# Altium footprint library ParsaLibrary.PcbLib: 526 footprints (part 2 of 33)
Each footprint in its own frame and in the unit in brackets; x right, y up, seen from the top. Pads: shape width x height; smd on the part's side, far side on the other; paste and mask are expansions set on the pad; w line width, h text height; cw(c..) or ccw(c..) is an arc to the next point about the centre after c.
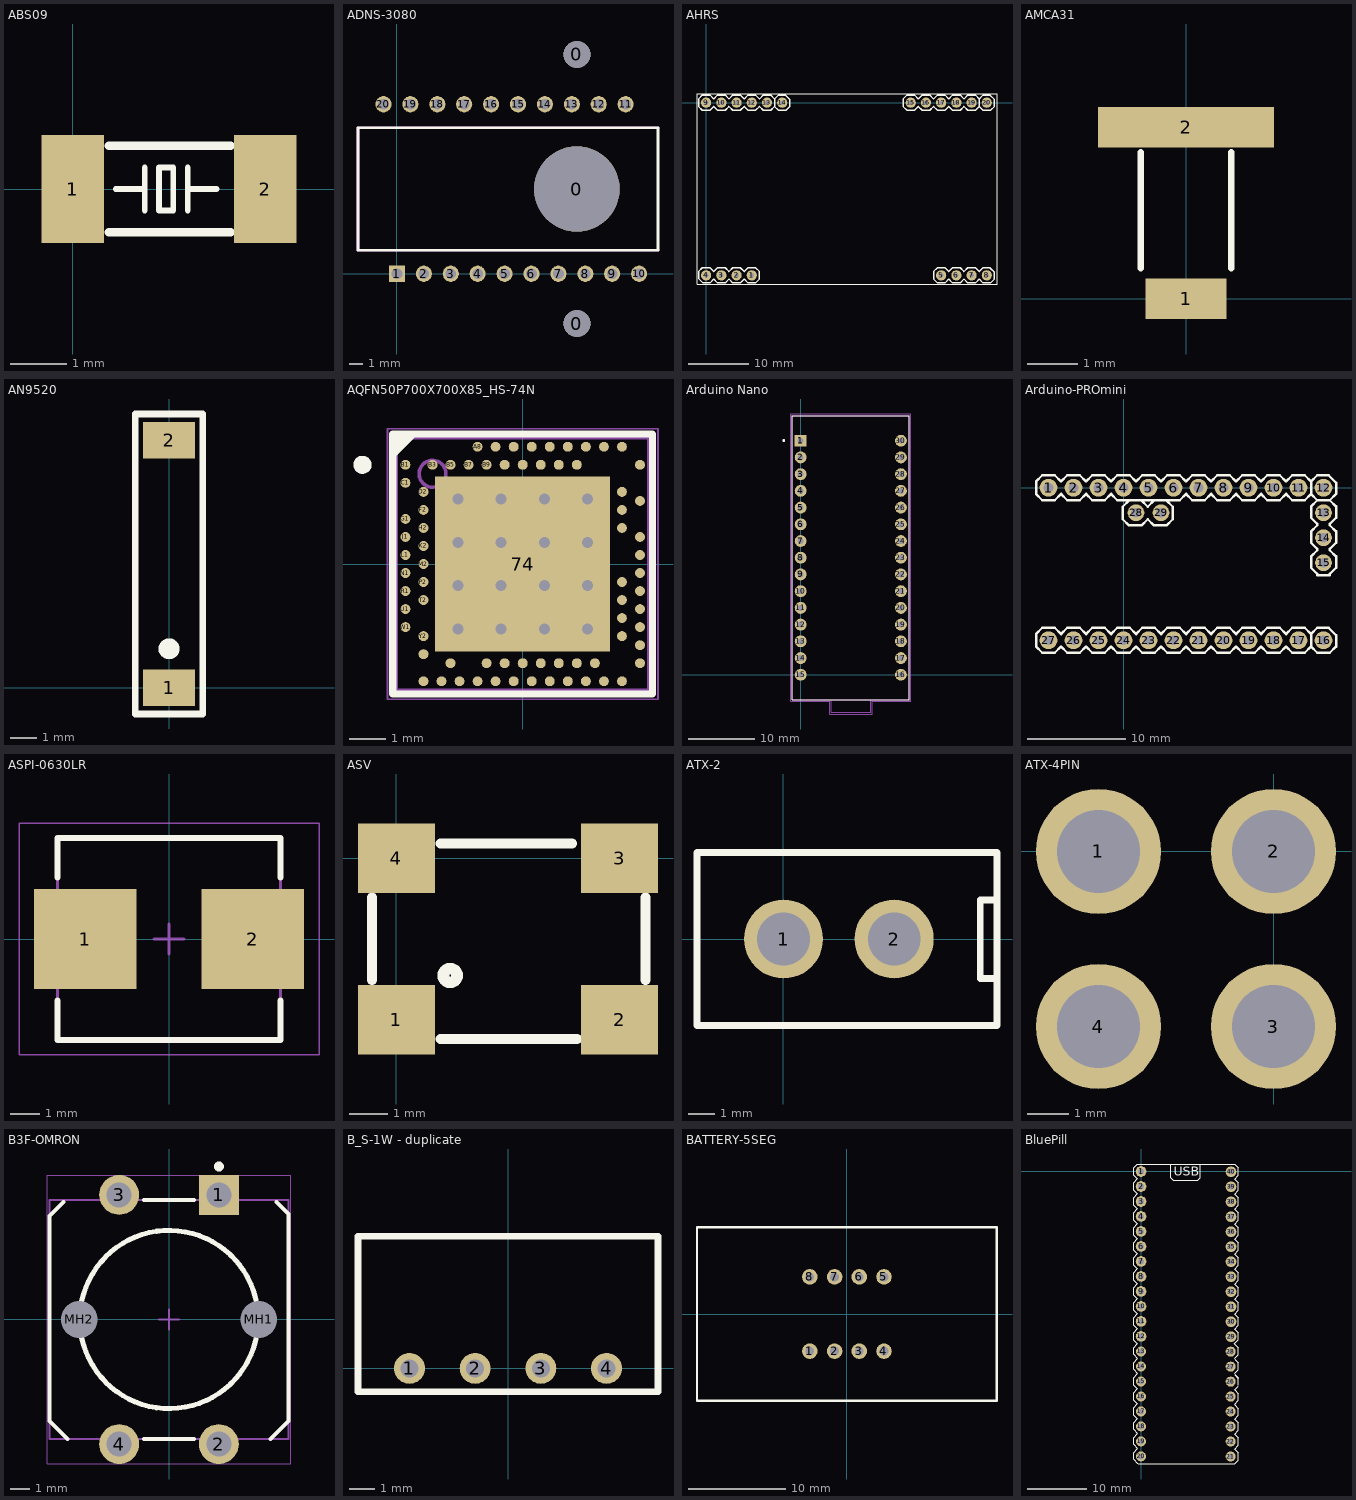
[diagram p1: the footprints below, top view; thin cyan lines are the x and y axes]

## ABS09 [mm] "CRYSTAL"
pads (2):
  rect 1.1x1.9 smd: 1(0,0) 2(3.4,0)
Top Overlay:
  lines w0.1: 0.762,0 1.27,0 ; 1.27,-0.381 1.27,0 ; 1.27,0.381 1.27,0 ; 2.032,-0.381 2.032,0.381 2.032,0 2.54,0 ; 1.524,-0.381 1.524,0.381 1.778,0.381 1.778,-0.381 1.524,-0.381
  lines w0.15: 0.635,-0.762 2.794,-0.762 ; 0.635,0.762 2.794,0.762
3D body "User Library-ABS09.STEP": height 0.9, standoff 0, extent -0.409,-0.762 3.711,0.758

## ADNS-3080 [mil]
pads (23):
  round 78.74 hole 78.74: 0(526.77,-145.67) 0(526.77,641.73)
  round 250 hole 250: 0(526.77,248.03)
  rect 47.25x47.25 hole 31.5: 1(0,0)
  round 47.25 hole 31.5: 2(78.74,0) 3(157.48,0) 4(236.22,0) 5(314.96,0) 6(393.7,0) 7(472.44,0) 8(551.18,0) 9(629.92,0) 10(708.66,0) 11(669.29,496.06) 12(590.55,496.06) 13(511.81,496.06) 14(433.07,496.06) 15(354.33,496.06) 16(275.59,496.06) 17(196.85,496.06) 18(118.11,496.06) 19(39.37,496.06) 20(-39.37,496.06)
Top Overlay:
  lines w8: -113.98,68.9 -113.98,427.16 763.98,427.16 763.98,68.9 -113.98,68.9
Mechanical 16:
  lines w8: 763.98,68.9 -113.98,68.9 -113.98,427.16 763.98,427.16

## AHRS [mm]
pads (20):
  round 1.7 hole 0.762: 1(7.62,-28.829) 2(5.08,-28.829) 3(2.54,-28.829) 4(0,-28.829) 5(39.243,-28.829) 6(41.783,-28.829) 7(44.323,-28.829) 8(46.863,-28.829) 9(0,0) 10(2.54,0) 11(5.08,0) 12(7.62,0) 13(10.16,0) 14(12.7,0) 15(34.163,0) 16(36.703,0) 17(39.243,0) 18(41.783,0) 19(44.323,0) 20(46.863,0)
Top Overlay:
  drawing of 152 lines, arcs and shapes, not listed
3D body "4pin.STEP": height 8.5, standoff -2.09, extent 38.024,-30.226 48.184,-27.686
3D body "4pin.STEP": height 8.5, standoff -2.09, extent -1.27,-30.15 8.89,-27.61
3D body "6pin.STEP": height 8.5, standoff -2.09, extent 32.995,-1.245 48.235,1.295
3D body "6pin.STEP": height 8.5, standoff -2.09, extent -1.245,-1.346 13.995,1.194
3D body "IMU.step": height 16.18, standoff 2.21, extent -1.607,-30.251 48.393,1.626

## AMCA31 [mm] "amd chip antenna"
pads (2):
  rect 1.6x0.8 smd: 1(0,0)
  rect 3.5x0.8 smd: 2(0,3.4)
Top Overlay:
  lines w0.127: -0.9,0.6 -0.9,2.9 ; 0.9,0.6 0.9,2.9
3D body "User Library-AMCA31-2R450G-S1F-T3.step": height 1.2, standoff 0, extent -0.8,0.1 0.8,3.3

## AN9520 [mm]
pads (2):
  rect 2x1.4 smd: 1(0,0) 2(0,9.5)
Top Overlay:
  circle w0.4: c0,1.5 r0.2
  lines w0.254: -1.3,-1 1.3,-1 1.3,10.5 -1.3,10.5 -1.3,-1
3D body "User Library-AN9520.step": height 1.05, standoff 0, extent -1.05,0.05 1.05,9.55

## AQFN50P700X700X85_HS-74N [mm]
pads (90):
  rect 4.85x4.85 smd paste-5 mask+0.05: 74(0,0)
  round 0.275 smd paste+0.012 mask+0.05: A8(-1.25,3.25) A10(-0.75,3.25) A12(-0.25,3.25) A14(0.25,3.25) A16(0.75,3.25) A18(1.25,3.25) A20(1.75,3.25) A22(2.25,3.25) A23(2.75,3.25) AA24(3.25,-2.25) AB2(-2.75,-2.5) AC5(-2,-2.75) AC9(-1,-2.75) AC11(-0.5,-2.75) AC13(0,-2.75) AC15(0.5,-2.75) AC17(1,-2.75) AC19(1.5,-2.75) AC21(2,-2.75) AC24(3.25,-2.75) AD2(-2.75,-3.25) AD4(-2.25,-3.25) AD6(-1.75,-3.25) AD8(-1.25,-3.25) AD10(-0.75,-3.25) AD12(-0.25,-3.25) AD14(0.25,-3.25) AD16(0.75,-3.25) AD18(1.25,-3.25) AD20(1.75,-3.25) AD22(2.25,-3.25) AD23(2.75,-3.25) B1(-3.25,2.75) B3(-2.5,2.75) B5(-2,2.75) B7(-1.5,2.75) B9(-1,2.75) B11(-0.5,2.75) B13(0,2.75) B15(0.5,2.75) B17(1,2.75) B19(1.5,2.75) B24(3.25,2.75) C1(-3.25,2.25) D2(-2.75,2) D23(2.75,2) E24(3.25,1.75) F2(-2.75,1.5) F23(2.75,1.5) G1(-3.25,1.25) H2(-2.75,1) H23(2.75,1) J1(-3.25,0.75) J24(3.25,0.75) K2(-2.75,0.5) L1(-3.25,0.25) L24(3.25,0.25) M2(-2.75,0) N1(-3.25,-0.25) N24(3.25,-0.25) P2(-2.75,-0.5) P23(2.75,-0.5) R1(-3.25,-0.75) R24(3.25,-0.75) T2(-2.75,-1) T23(2.75,-1) U1(-3.25,-1.25) U24(3.25,-1.25) V23(2.75,-1.5) W1(-3.25,-1.75) W24(3.25,-1.75) Y2(-2.75,-2) Y23(2.75,-2)
  rrect50% 0.94x0.94 on Top Paste: ""(-1.71,-1.71) ""(-1.71,-0.57) ""(-1.71,0.57) ""(-1.71,1.71) ""(-0.57,-1.71) ""(-0.57,-0.57) ""(-0.57,0.57) ""(-0.57,1.71) ""(0.57,-1.71) ""(0.57,-0.57) ""(0.57,0.57) ""(0.57,1.71) ""(1.71,-1.71) ""(1.71,-0.57) ""(1.71,0.57) ""(1.71,1.71)
via 1.8,-1.8 diameter 0.61 hole 0.305
via 0.6,-1.8 diameter 0.61 hole 0.305
via -0.6,-1.8 diameter 0.61 hole 0.305
via -1.8,-1.8 diameter 0.61 hole 0.305
via 1.8,-0.6 diameter 0.61 hole 0.305
via 0.6,-0.6 diameter 0.61 hole 0.305
via -0.6,-0.6 diameter 0.61 hole 0.305
via -1.8,-0.6 diameter 0.61 hole 0.305
via 1.8,0.6 diameter 0.61 hole 0.305
via 0.6,0.6 diameter 0.61 hole 0.305
via -0.6,0.6 diameter 0.61 hole 0.305
via -1.8,0.6 diameter 0.61 hole 0.305
via 1.8,1.8 diameter 0.61 hole 0.305
via 0.6,1.8 diameter 0.61 hole 0.305
via -0.6,1.8 diameter 0.61 hole 0.305
via -1.8,1.8 diameter 0.61 hole 0.305
Top Overlay:
  circle w0.25: c-4.44,2.75 r0.125
  region: -3,3.5 -3.5,3 -3.5,3.5
  lines w0.2: -3.6,-3.6 3.6,-3.6 3.6,3.6 -3.6,3.6 -3.6,-3.6
Mechanical 7:
  circle w0.1: c-2.5,2.5 r0.373
  lines w0.1: -3.5,-3.5 -3.5,3.5 3.5,3.5 3.5,-3.5 -3.5,-3.5
  text ".Designator" at -0.75,-0.25 h0.38
Mechanical 15:
  lines w0.05: -3.75,-3.75 3.75,-3.75 3.75,3.75 -3.75,3.75 -3.75,-3.75
  lines w0.1: -0.5,0 0.5,0 ; 0,-0.5 0,0.5
3D body "LGA88C25P25X25_700X700X85.step": height 0.85, standoff 0, extent -3.55,-3.55 3.55,3.55

## Arduino Nano [mm]
pads (30):
  rect 1.8x1.8 hole 0.9: 1(-0.005,35.549)
  round 1.8 hole 0.9: 2(-0.005,33.009) 3(-0.005,30.469) 4(-0.005,27.929) 5(-0.005,25.389) 6(-0.005,22.849) 7(-0.005,20.309) 8(-0.005,17.769) 9(-0.005,15.229) 10(-0.005,12.689) 11(-0.005,10.149) 12(-0.005,7.609) 13(-0.005,5.069) 14(-0.005,2.529) 15(-0.005,-0.011) 16(15.235,-0.011) 17(15.235,2.529) 18(15.235,5.069) 19(15.235,7.609) 20(15.235,10.149) 21(15.235,12.689) 22(15.235,15.229) 23(15.235,17.769) 24(15.235,20.309) 25(15.235,22.849) 26(15.235,25.389) 27(15.235,27.929) 28(15.235,30.469) 29(15.235,33.009) 30(15.235,35.549)
Top Overlay:
  circle w0.2: c-2.585,35.569 r0.1
  lines w0.127: -1.275,-3.821 -1.275,39.359 16.505,39.359 16.505,-3.821 -1.275,-3.821
Mechanical 13:
  circle w0.2: c-2.585,35.569 r0.1
  lines w0.127: 4.645,-3.821 4.645,-5.726 10.615,-5.726 10.615,-3.821 ; 4.645,-3.821 -1.275,-3.821 -1.275,39.359 16.505,39.359 16.505,-3.821 10.615,-3.821 ; 4.645,-3.821 10.615,-3.821
Mechanical 15:
  lines w0.05: -1.525,-4.071 4.395,-4.071 4.395,-5.976 10.865,-5.976 10.865,-4.071 16.755,-4.071 16.755,39.609 -1.525,39.609 -1.525,-4.071
3D body "User Library-arduino_nano.STEP": height 12.64, standoff -5.96, extent -1.385,-5.641 16.614,39.359

## Arduino-PROmini [mm]
pads (29):
  round 1.8 hole 1: 1(-7.62,0) 2(-5.08,0) 3(-2.54,0) 4(0,0) 5(2.54,0) 6(5.08,0) 7(7.62,0) 8(10.16,0) 9(12.7,0) 10(15.24,0) 11(17.78,0) 12(20.32,0) 16(20.32,-15.5) 17(17.78,-15.5) 18(15.24,-15.5) 19(12.7,-15.5) 20(10.16,-15.5) 21(7.62,-15.5) 22(5.08,-15.5) 23(2.54,-15.5) 24(0,-15.5) 25(-2.54,-15.5) 26(-5.08,-15.5) 27(-7.62,-15.5)
  round 1.7 hole 1: 13(20.32,-2.54) 14(20.32,-5.08) 15(20.32,-7.62) 28(1.27,-2.54) 29(3.81,-2.54)
Top Overlay:
  drawing of 209 lines, arcs and shapes, not listed
3D body "2pinheader.STEP": height 0.84, standoff -10.08, extent -3.81,-1.27 1.27,1.27
3D body "2pinheader.STEP": height 0.84, standoff -10.08, extent 1.27,-1.27 6.35,1.27
3D body "2pinheader.STEP": height 0.84, standoff -10.08, extent 6.35,-1.27 11.43,1.27
3D body "2pinheader.STEP": height 0.84, standoff -10.08, extent 11.43,-1.27 16.51,1.27
3D body "2pinheader.STEP": height 0.74, standoff -10.18, extent 16.51,-1.27 21.59,1.27
3D body "2pinheader.STEP": height 8.38, standoff -2.54, extent 18.98,-6.28 21.52,-1.2
3D body "2pinheader.STEP": height 0.84, standoff -10.08, extent -8.89,-1.27 -3.81,1.27
3D body "2pinheader.STEP": height 0.84, standoff -10.08, extent -8.89,-16.77 -3.81,-14.23
3D body "2pinheader.STEP": height 0.74, standoff -10.18, extent 16.51,-16.77 21.59,-14.23
3D body "2pinheader.STEP": height 0.84, standoff -10.08, extent 11.43,-16.77 16.51,-14.23
3D body "2pinheader.STEP": height 0.84, standoff -10.08, extent 6.35,-16.77 11.43,-14.23
3D body "2pinheader.STEP": height 0.84, standoff -10.08, extent 1.27,-16.77 6.35,-14.23
3D body "2pinheader.STEP": height 0.84, standoff -10.08, extent -3.81,-16.77 1.27,-14.23
3D body "2pinheader.STEP": height 8.38, standoff -2.54, extent 18.98,-8.84 21.52,-3.76
3D body "2pinheader.STEP": height 8.38, standoff -2.54, extent -0.04,-3.8 5.04,-1.26

## ASPI-0630LR [mm] "Molded Inductor, 2-Leads, Body 7.10x6.60mm, IPC Low Density"
height 3
pads (2):
  rect 3.45x3.35 smd: 1(-2.825,0) 2(2.825,0)
Top Overlay:
  lines w0.2: -3.75,-2.075 -3.75,-3.4 3.75,-3.4 3.75,-2.075 ; -3.75,2.075 -3.75,3.4 3.75,3.4 3.75,2.075
Top Courtyard:
  lines w0.05: -5.05,-3.9 -5.05,3.9 5.05,3.9 5.05,-3.9 -5.05,-3.9
  lines w0.1: -0.5,0 0.5,0 ; 0,-0.5 0,0.5
Top Assembly:
  lines w0.1: -3.75,-3.4 -3.75,3.4 3.75,3.4 3.75,-3.4 -3.75,-3.4
3D body "ASPI-0630LR.step": height 3, standoff 0, extent -3.97,-3.4 3.97,3.4

## ASV [mm] "OSC 5x7"
pads (4):
  rect 2x1.8 smd: 1(0,-4.2) 2(5.8,-4.2) 3(5.8,0) 4(0,0)
Top Overlay:
  circle w0.3: c1.397,-3.048 r0.18
  lines w0.254: -0.635,-3.175 -0.635,-1.016 ; 1.143,-4.699 4.699,-4.699 ; 1.143,0.381 4.572,0.381 ; 6.477,-3.175 6.477,-1.016
3D body "User Library-ASV-Oscil.STEP": height 1.8, standoff 0, extent -0.579,-4.699 6.421,0.381

## ATX-2 [mm]
pads (2):
  round 3 hole 2: 1(0.008,0) 2(4.208,0)
Top Overlay:
  lines w0.254: 8.079,-1.501 7.478,-1.501 7.478,1.484 8.112,1.484 ; -3.276,-3.285 -3.276,3.285 8.112,3.285 8.112,-3.285 -3.276,-3.285
3D body "User Library-874270242.step": height 13.5, standoff -3.3, extent -3.291,-3.317 8.109,3.283

## ATX-4PIN [mm]
pads (4):
  round 3 hole 2: 1(-4.2,0) 2(0,0) 3(0,-4.2) 4(-4.2,-4.2)
3D body "plug_cpu_power_female_4-pin.stEp": height 24.88, standoff 0, extent -8.059,-7.732 4.241,3.668
3D body: height 10, standoff -5, extent -5.183,-5.443 -3.191,-3.447
3D body: height 25, standoff -5, extent -0.992,-5.443 1,-3.447
3D body: height 10, standoff -5, extent -5.183,-0.998 -3.191,0.998
3D body: height 10, standoff -5, extent -0.992,-0.998 1,0.998

## B3F-OMRON [mm] "12mmx12mm"
height 10
pads (6):
  rect 2x2 hole 1.25: 1(2.5,6.25)
  round 2 hole 1.25: 2(2.5,-6.25) 3(-2.5,6.25) 4(-2.5,-6.25)
  round 1.55 hole 1.85 unplated: MH1(4.5,0) MH2(-4.5,0)
Top Overlay:
  circle w0.25: c2.5,7.675 r0.125
  circle w0.254: c0,0 r4.472
  lines w0.2: -5.3,5.9 -6,5.2 -6,-5.1 -5.1,-6 ; -1.25,-6 1.25,-6 ; -1.25,6 1.25,6 ; 5.1,-6 6,-5.1 6,5.3 5.4,5.9
Mechanical 13:
  lines w0.1: -6,-6 -6,6 6,6 6,-6 -6,-6
Mechanical 15:
  lines w0.05: -6.1,-7.225 6.1,-7.225 6.1,7.225 -6.1,7.225 -6.1,-7.225
  lines w0.1: -0.5,0 0.5,0 ; 0,-0.5 0,0.5
3D body "User Library-OMROM[B3-4055]-1.step": height 7.3, standoff -4.2, extent -6,-7.051 6,7.051

## B_S-1W - duplicate [mm]
pads (4):
  round 1.2 hole 0.7: 1(-3.81,0) 2(-1.27,0) 3(1.27,0) 4(3.81,0)
Top Overlay:
  lines w0.254: -5.8,-0.9 -5.8,5.1 5.8,5.1 5.8,-0.9 -5.8,-0.9

## BATTERY-5SEG [mm]
pads (8):
  round 1.6 hole 0.9: 1(-3.81,-3.81) 2(-1.27,-3.81) 3(1.27,-3.81) 4(3.81,-3.81) 5(3.81,3.81) 6(1.27,3.81) 7(-1.27,3.81) 8(-3.81,3.81)
Top Overlay:
  lines w0.254: 15.401,-8.899 15.401,8.901 -15.399,8.901 -15.399,-8.899 -15.382,-8.899 15.418,-8.899

## BluePill [mm]
pads (40):
  round 1.8 hole 1: 1(0,0) 2(0,-2.54) 3(0,-5.08) 4(0,-7.62) 5(0,-10.16) 6(0,-12.7) 7(0,-15.24) 8(0,-17.78) 9(0,-20.32) 10(0,-22.86) 11(0,-25.4) 12(0,-27.94) 29(15.24,-27.973) 30(15.24,-25.433) 31(15.24,-22.893) 32(15.24,-20.353) 33(15.24,-17.813) 34(15.24,-15.273) 35(15.24,-12.733) 36(15.24,-10.193) 37(15.24,-7.653) 38(15.24,-5.113) 39(15.24,-2.573) 40(15.24,-0.033)
  round 1.7 hole 1: 13(0,-30.48) 14(0,-33.02) 15(0,-35.56) 16(0,-38.1) 17(0,-40.64) 18(0,-43.18) 19(0,-45.72) 20(0,-48.26) 21(15.19,-48.293) 22(15.19,-45.753) 23(15.19,-43.213) 24(15.19,-40.673) 25(15.19,-38.133) 26(15.19,-35.593) 27(15.19,-33.053) 28(15.19,-30.513)
Top Overlay:
  lines w0.15: 5.027,1.238 5.027,-1.032 5.452,-1.457 9.626,-1.457 10.036,-1.047 10.036,1.268
  lines w0.2: -1.27,-36.068 -1.27,-34.925 ; -0.635,-46.99 -1.27,-47.625 -1.27,-48.768 -0.635,-49.403 -0.487,-49.551 15.866,-49.551 16.501,-48.916 16.501,-47.646 15.866,-47.011 16.501,-46.376 16.501,-45.106 15.866,-44.471 16.501,-43.836 16.501,-42.566 15.866,-41.931 16.501,-41.296 16.501,-40.153 15.866,-39.518 ; -0.635,-46.863 -1.27,-46.228 -1.27,-45.085 -0.635,-44.45 ; -0.635,-44.323 -1.27,-43.688 -1.27,-42.545 -0.635,-41.91 -1.27,-41.275 -1.27,-40.005 -0.635,-39.37 -1.27,-38.735 -1.27,-37.465 -0.635,-36.83 -1.27,-36.195 -1.27,-34.925 ; -0.635,-34.29 -1.27,-34.925 ; -0.635,-34.163 -1.27,-33.528 -1.27,-32.385 -0.635,-31.75 ; -0.635,-31.623 -1.27,-30.988 -1.27,-29.845 -0.635,-29.21 -1.27,-28.575 -1.27,-27.305 -0.635,-26.67 -1.27,-26.035 -1.27,-24.765 -0.635,-24.13 -1.27,-23.495 -1.27,-22.225 -0.635,-21.59 -1.27,-20.955 -1.27,-19.685 -0.635,-19.05 -1.27,-18.415 -1.27,-17.145 -0.635,-16.51 -1.27,-15.875 -1.27,-14.605 -0.635,-13.97 -1.27,-13.335 -1.27,-12.065 -0.635,-11.43 -1.27,-10.795 -1.27,-9.525 -0.635,-8.89 -1.27,-8.255 -1.27,-6.985 -0.635,-6.35 -1.27,-5.715 -1.27,-4.445 -0.635,-3.81 -1.27,-3.175 -1.27,-1.905 -0.635,-1.27 -1.27,-0.635 -1.27,0.635 -0.635,1.27 ; -0.635,1.249 15.866,1.249 16.501,0.614 16.501,-0.021 16.501,-0.656 15.866,-1.291 16.501,-1.926 16.501,-2.561 16.501,-3.196 15.866,-3.831 16.501,-4.466 16.501,-5.101 16.501,-5.736 15.866,-6.371 16.501,-7.006 16.501,-7.641 16.501,-8.276 15.866,-8.911 16.501,-9.546 ; 15.866,-39.391 16.501,-38.756 16.501,-37.613 15.866,-36.978 16.501,-36.343 ; 15.866,-34.438 16.501,-35.073 16.501,-36.216 ; 15.866,-34.311 16.501,-34.946 16.501,-36.089 ; 15.866,-34.184 16.501,-33.549 16.501,-32.406 15.866,-31.771 ; 15.866,-31.644 16.501,-31.009 16.501,-29.866 15.803,-29.167 16.501,-28.469 16.501,-27.326 15.866,-26.691 16.501,-26.056 16.501,-25.421 16.501,-24.786 15.866,-24.151 16.501,-23.516 16.501,-22.881 ; 16.501,-23.389 16.501,-22.246 15.866,-21.611 16.501,-20.976 16.501,-20.341 ; 16.501,-13.229 16.501,-12.086 15.866,-11.451 16.501,-10.816 16.501,-10.181 ; 16.501,-12.721 16.501,-13.356 15.866,-13.991 16.501,-14.626 16.501,-15.261 ; 16.501,-20.341 16.501,-19.706 ; 16.501,-20.341 16.501,-19.706 ; 16.501,-19.706 15.866,-19.071 16.501,-18.436 16.501,-17.801 16.501,-17.166 15.866,-16.531 16.501,-15.896 ; 16.501,-15.896 16.501,-15.261 ; 16.501,-15.896 16.501,-15.261 ; 16.501,-10.181 16.501,-9.546 ; 16.501,-10.181 16.501,-9.546
  text "USB" at 5.545,-0.749 h1.52
3D body "2pinheader.STEP": height -1.62, standoff -12.54, extent -1.27,-3.81 1.27,1.27
3D body "YAAJ_BluePill.step": height 20.1, standoff 7.6, extent -3.68,-50.63 18.92,2.37
3D body "2pinheader.STEP": height -1.62, standoff -12.54, extent -1.27,-8.89 1.27,-3.81
3D body "2pinheader.STEP": height -1.62, standoff -12.54, extent -1.27,-13.97 1.27,-8.89
3D body "2pinheader.STEP": height -1.62, standoff -12.54, extent -1.27,-19.05 1.27,-13.97
3D body "2pinheader.STEP": height -1.62, standoff -12.54, extent -1.27,-24.13 1.27,-19.05
3D body "2pinheader.STEP": height -1.62, standoff -12.54, extent -1.27,-29.21 1.27,-24.13
3D body "2pinheader.STEP": height -1.62, standoff -12.54, extent -1.27,-34.29 1.27,-29.21
3D body "2pinheader.STEP": height -1.62, standoff -12.54, extent -1.27,-39.37 1.27,-34.29
3D body "2pinheader.STEP": height -1.62, standoff -12.54, extent -1.27,-44.45 1.27,-39.37
3D body "2pinheader.STEP": height -1.62, standoff -12.54, extent -1.27,-49.53 1.27,-44.45
3D body "2pinheader.STEP": height -1.62, standoff -12.54, extent 13.97,-8.923 16.51,-3.843
3D body "2pinheader.STEP": height -1.62, standoff -12.54, extent 13.97,-14.003 16.51,-8.923
3D body "2pinheader.STEP": height -1.62, standoff -12.54, extent 13.97,-19.083 16.51,-14.003
3D body "2pinheader.STEP": height -1.62, standoff -12.54, extent 13.97,-24.163 16.51,-19.083
3D body "2pinheader.STEP": height -1.62, standoff -12.54, extent 13.97,-29.243 16.51,-24.163
3D body "2pinheader.STEP": height -1.62, standoff -12.54, extent 13.97,-34.323 16.51,-29.243
3D body "2pinheader.STEP": height -1.62, standoff -12.54, extent 13.97,-39.403 16.51,-34.323
3D body "2pinheader.STEP": height -1.62, standoff -12.54, extent 13.97,-44.483 16.51,-39.403
3D body "2pinheader.STEP": height -1.62, standoff -12.54, extent 13.97,-49.563 16.51,-44.483
3D body "2pinheader.STEP": height -1.62, standoff -12.54, extent 13.97,-3.843 16.51,1.237